# Altium integrated library Diffuser.IntLib: 173 symbols (continued)
## Linear Regulators - TPS7A0533PDBVT (continued)
IC REG LINEAR 3.3V 200MA SOT23-5; Manufacturer: Texas Instruments; PartNumber: TPS7A0508PDBVR; RefDes: RefDes; Type: DEV; Value: Value; Copyright: Copyright (C) 2021 Accelerated Designs. All rights reserved; Cost: 1.26; Website: https://www.digikey.co.nz/product-detail/en/texas-instruments/TPS7A0533PDBVT/296-50256-6-ND/9597159
footprint SOT-23-5
pins: 1 IN (power), 2 GND (power), 3 EN (in), 4 NC (power), 5 OUT (power)

## MAX14515AEWA+T
designator U?
Liquid Lens Driver for Small Camera Modules; Mfr_Name: Analog Devices Inc; Copyright: Copyright (C) 2023 Ultra Librarian. All rights reserved.; Manufacturer_Part_Number: MAX14515AEWA+T; Digi-Key_Part_Number_1: 175-MAX14515AEWA+TTR-ND; Digi-Key_Part_Number_2: 2156-MAX14515AEWA+T-ND; Digi-Key_Part_Number_3: MAX14515AEWA+T-ND; Digi-Key_Part_Number_4: MAX14515AEWA+TCT-ND; Digi-Key_Part_Number_5: MAX14515AEWA+TDKR-ND; Digi-Key_Part_Number_6: MAX14515AEWA+TTR-ND; RefDes: RefDes; Type: DEV
footprint 21-0210C_W81A2-1_MXM
pins: 1 SCL, 2 EN, 3 GND (power), 4 VA, 5 SDA, 6 VDD (power), 7 VREF (power), 8 VB

## MAX22246CAWA+
designator U?
CAN, RS232, RS422, RS485 Digital Isolator 5000Vrms 2 Channel 200Mbps 50kV/µs (Typ) CMTI 8-SOIC (0.295", 7.50mm Width); Mfr_Name: Analog Devices Inc; Copyright: Copyright (C) 2023 Ultra Librarian. All rights reserved.; Manufacturer_Part_Number: MAX22246CAWA+; Digi-Key_Part_Number_1: 175-MAX22246CAWA+-ND; RefDes: RefDes; Type: DEV
footprint 21-100415_MXM
pins: 1 VDDA (power), 2 OUT1 (out), 3 IN2 (in), 4 GNDA (power), 5 GNDB (power), 6 OUT2 (out), 7 IN1 (in), 8 VDDB (power)

## MBRM120LT3G
designator D?
Diode 20 V 1A Surface Mount Powermite; Mfr_Name: onsemi; Type: DEV; Copyright: Copyright (C) 2024 Ultra Librarian. All rights reserved.; Manufacturer_Part_Number: MBRM120LT3G; RefDes: RefDes
footprint DO-216AA (Footprint not found)
pins: 1 K, 2 A

## MCP4725A2T-ECH
designator U?, comment MCP4725A2T-E/CH
I2C DAC; Mfr_Name: Microchip; Copyright: Copyright (C) 2024 Ultra Librarian. All rights reserved.; Manufacturer_Part_Number: MCP4725A2T-E/CH; RefDes: RefDes; Type: DEV
footprint SOT-23-6_MC_MCH
pins: 1 VOUT, 2 VSS, 3 VDD, 4 SDA, 5 SCL, 6 A0

## MCP4822T-ESN
designator U?, comment MCP4822T-E/SN
12 Bit Digital to Analog Converter 2 8-SOIC; Mfr_Name: Microchip; Copyright: Copyright (C) 2024 Ultra Librarian. All rights reserved.; Manufacturer_Part_Number: MCP4822T-E/SN; RefDes: RefDes; Type: DEV
footprint MSOP8_MC_MCH-M (Footprint not found)
pins: 1 VDD, 2 nCS, 3 SCK, 4 SDI, 5 nLDAC, 6 VOUTB, 7 GND, 8 VOUTA

## MCP4921
designator U?, comment MCP4921-E/SN-ND
12 Bit Digital to Analog Converter 1 8-SOIC; Mfr_Name: Microchip; Manufacturer_Part_Number: MCP4822T-E/SN; Copyright: Copyright (C) 2024 Ultra Librarian. All rights reserved.; RefDes: RefDes; Type: DEV
footprint 8-SOIC - DAC
pins: 1 VDD, 2 nCS, 3 SCK, 4 SDI, 5 nLDAC, 6 VREFA, 7 GND, 8 VOUTA

## MCP7940M-ISN
designator U?, comment MCP7940M-I/SN
Real Time Clock (RTC) IC Clock/Calendar 64B I2C, 2-Wire Serial 8-SOIC (0.154", 3.90mm Width); Mfr_Name: Microchip; Copyright: Copyright (C) 2024 Ultra Librarian. All rights reserved.; Manufacturer_Part_Number: MCP7940M-I/SN; RefDes: RefDes; Type: DEV
footprint SOIC8-N_MC_MCH (Footprint not found)
pins: 1 X1 (in), 2 X2 (out), 4 GND (power), 5 SDA (io), 6 SCL (in), 7 MFP (out), 8 VCC (power)

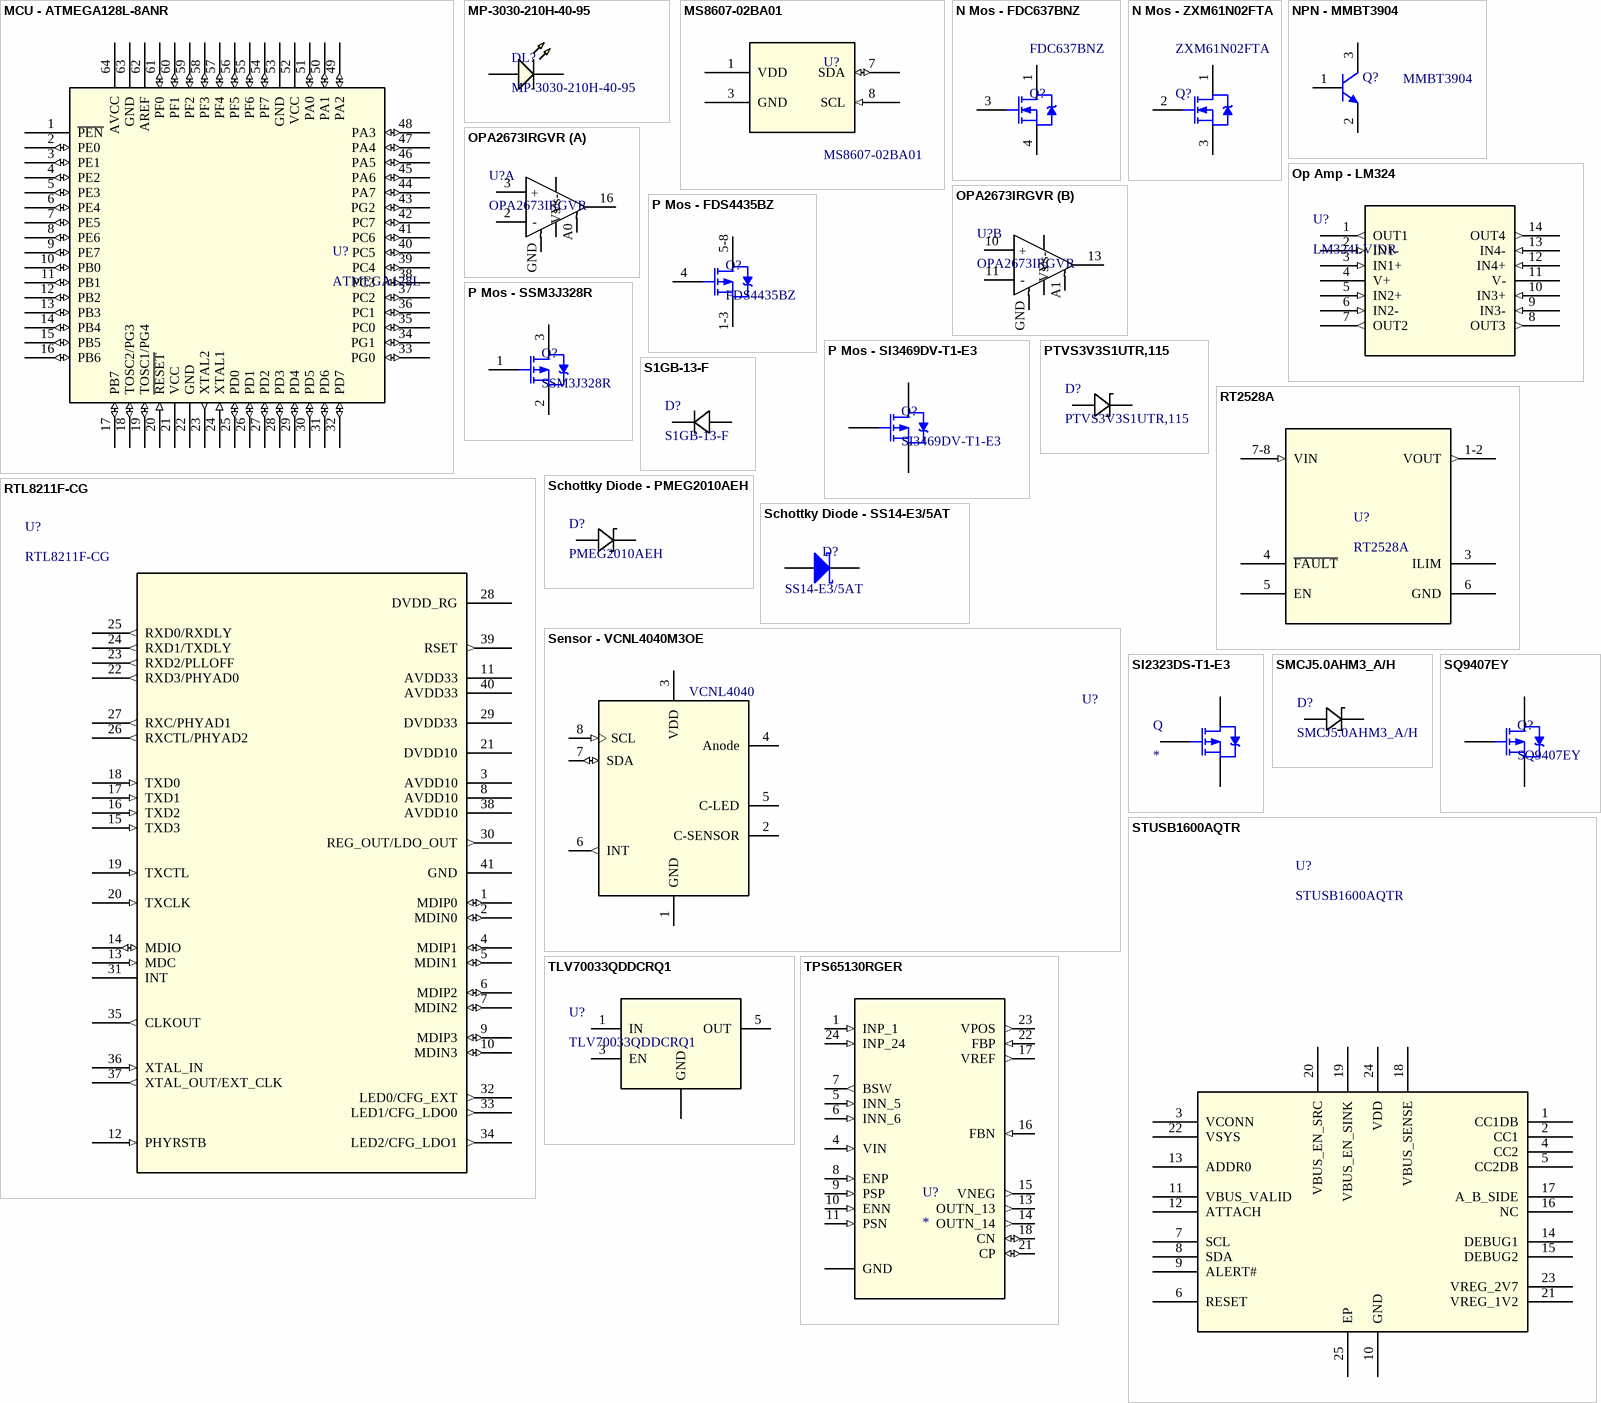
[diagram p4: symbols MCU - ATMEGA128L-8ANR to TPS65130RGER]

## MCU - ATMEGA128L-8ANR
designator U?, comment ATMEGA128L
IC MCU 8BIT 128KB FLASH 64TQFP; Cost: 9.46000; Website: https://www.digikey.co.nz/product-detail/en/microchip-technology/ATMEGA128L-8ANR/1611-ATMEGA128L-8ANRCT-ND/6831916
footprint 64-TQFP
pins: 1 ~{PEN}, 2 PE0 (io), 3 PE1 (io), 4 PE2 (io), 5 PE3 (io), 6 PE4 (io), 7 PE5 (io), 8 PE6 (io), 9 PE7 (io), 10 PB0 (io), 11 PB1 (io), 12 PB2 (io), 13 PB3 (io), 14 PB4 (io), 15 PB5 (io), 16 PB6 (io), 17 PB7 (io), 18 TOSC2/PG3 (io), 19 TOSC1/PG4 (io), 20 ~{RESET} (in), 21 VCC (power), 22 GND (power), 23 XTAL2 (out), 24 XTAL1 (in), 25 PD0 (io), 26 PD1 (io), 27 PD2 (io), 28 PD3 (io), 29 PD4 (io), 30 PD5 (io), 31 PD6 (io), 32 PD7 (io), 33 PG0 (io), 34 PG1 (io), 35 PC0 (io), 36 PC1 (io), 37 PC2 (io), 38 PC3 (io), 39 PC4 (io), 40 PC5 (io), 41 PC6 (io), 42 PC7 (io), 43 PG2 (io), 44 PA7 (io), 45 PA6 (io), 46 PA5 (io), 47 PA4 (io), 48 PA3 (io), 49 PA2 (io), 50 PA1 (io), 51 PA0 (io), 52 VCC (power), 53 GND (power), 54 PF7 (io), 55 PF6 (io), 56 PF5 (io), 57 PF4 (io), 58 PF3 (io), 59 PF2 (io), 60 PF1 (io), 61 PF0 (io), 62 AREF, 63 GND (power), 64 AVCC (power)

## MP-3030-210H-40-95
designator DL?
LED Lighting MP-3030-210H White, Neutral 4000K 6V 150mA 110° 1212 (3030 Metric); Dot: Cathode
footprint LED_MP-3030-21C2-40-90
pins: A, C 1

## MS8607-02BA01
designator U?
PHT Combination Sensor QFN package 5 x 3 x 1 mm3; Manufacturer_Name: TE Connectivity; Geometry.Height: 1mm; Manufacturer_Part_Number: MS8607-02BA01; Mouser Part Number: N/A; Mouser Price/Stock: https://www.mouser.co.uk/ProductDetail/TE-Connectivity/MS8607-02BA01?qs=DRkmTr78QARZ5izyG9yiPQ%3D%3D; Arrow Part Number: *; Arrow Price/Stock: *; Mouser Testing Part Number: *; Mouser Testing Price/Stock: *; Datasheet Link: https://www.datasheet5.com/part/MS8607-02BA01/TE%20Connectivity%20Ltd
footprint MS860702BA01
pins: 1 VDD, 3 GND, 7 SDA (io), 8 SCL (in)

## N Mos - FDC637BNZ
designator Q?, comment FDC637BNZ
MOSFET N-CH 20V 6.2A TSOT-23-6; Cost: 0.76; Website: https://www.digikey.co.nz/product-detail/en/on-semiconductor/FDC637BNZ/FDC637BNZCT-ND/1768373; Manufacturer Part Number: FDC637BNZ
footprint 6TSOP
pins: 1 3 "Drain", 3 1 "Gate", 4 "Source"

## N Mos - ZXM61N02FTA
designator Q?, comment ZXM61N02FTA
MOSFET N-CH 20V 1.7A SOT23-3; Manufacturer: Diodes Inc; FET Type: MOSFET N-Channel, Metal Oxide; Gate Charge (Qg) @ Vgs: 3.4nC @ 4.5V; Input Capacitance (Ciss) @ Vds: 160pF @ 15V; Power - Max: 625mW; Rds On (Max) @ Id, Vgs: 180 mOhm @ 930mA, 4.5V; Vgs(th) (Max) @ Id: 700mV @ 250µA; Supplier 1: Farnell; Supplier 2: Digi-Key; Current - Continuous Drain (Id) @ 25° C: 1.7A; Drain to Source Voltage (Vdss): 20V; Package / Case: TO-236-3, SC-59, SOT-23-3; Pricing: 1=0.79, 10=0.658, 25=0.5772, 100=0.4939, 250=0.42836, 500=0.36284, 1000=0.27972 (NZD); Supplier Part Number 1: 9525270; Supplier Part Number 2: ZXM61N02FCT-ND; Storage Location: PCB Assembly WS; Supplier: ECE Dept; Cost: 0.8; Website: https://www.digikey.co.nz/product-detail/en/diodes-incorporated/ZXM61N02FTA/ZXM61N02FCT-ND/272443; Manufacturer Part Number: ZXM61N02FTA
footprint SOT-23F
pins: 1 3 "Drain", 2 1 "Gate", 3 4 "Source"

## NPN - MMBT3904
designator Q?, comment MMBT3904
TRANS NPN 40V 200MA TO236AB; Manufacturer: NXP; Cost: 0.17; Website: https://www.digikey.co.nz/product-detail/en/nexperia-usa-inc/MMBT3904-215/1727-4044-1-ND/1944320; Value: MMBT3904
footprint SOT23_NXP-M
pins: 1, 2, 3

## Op Amp - LM324
designator U?, comment LM324LVIDR
IC OPAMP GP 4 CIRCUIT 14SOIC; Cost: 0.79; Website: https://www.digikey.co.nz/product-detail/en/texas-instruments/LM324LVIDR/296-51262-1-ND/9745626
footprint 14-SOIC
pins: 1 OUT1 (out), 2 IN1- (in), 3 IN1+ (in), 4 V+ (power), 5 IN2+ (in), 6 IN2- (in), 7 OUT2 (out), 8 OUT3 (out), 9 IN3- (in), 10 IN3+ (in), 11 V- (power), 12 IN4+ (in), 13 IN4- (in), 14 OUT4 (out)

## OPA2673IRGVR
designator U?
Current Feedback Amplifier 2 Circuit 16-VQFN (4x4); Mfr_Name: Texas Instruments; Copyright: Copyright (C) 2024 Ultra Librarian. All rights reserved.; Manufacturer_Part_Number: OPA2673IRGVR; RefDes: RefDes; Type: DEV
footprint RGV16_2P16X2P16
part A pins: 2 IN- (hiz), 3 IN+ (hiz), 7 Vs- (power), 14 Vs+ (power), 16 OUTA, A0, GND (power)
part B pins: 7 Vs- (power), 10 IN+ (hiz), 11 IN- (hiz), 13 OUTA, 14 Vs+ (power), A1, GND (power)
part A text: +; -
part B text: +; -

## P Mos - FDS4435BZ
designator Q?, comment FDS4435BZ
MOSFET P-CH 30V 8.8A 8SOIC; MF: ON Semiconductor / Fairchild; DigiKey-Purchase-URL: https://snapeda.com/shop?store=DigiKey&id=4825985; Package: None; SnapEDA_Link: https://www.snapeda.com/parts/FDS4435BZ/Fairchild%20Semiconductor/view-part/4825985/?ref=snap; Value: *; Mouser-Purchase-URL: https://snapeda.com/shop?store=Mouser&id=4825985; MP: FDS4435BZ; Arrow_Electronics-Purchase-URL: https://snapeda.com/shop?store=Arrow+Electronics&id=4825985; Availability: Unavailable; Price: None; Cost: 1.04; Website: https://www.digikey.co.nz/product-detail/en/on-semiconductor/FDS4435BZ/FDS4435BZCT-ND/1305829
footprint SO08-E3
pins: 1-3 2 "Source", 4 1 "Gate", 5-8 3 "Drain"

## P Mos - SI3469DV-T1-E3
designator Q?, comment SI3469DV-T1-E3
MOSFET P-CH 20V 5A 6TSOP; Built_By: EMA_Anthony; Vendor: Vishay; SourceLibrary: Vishay_2019-11-13; Type: DEV; Copyright: Copyright (C) 2018 Accelerated Designs. All rights reserved; Datasheet: VY1332M51Y5UC63V0; Manufacturer_Part_Number: SI3469DV-T1-E3; RefDes: RefDes; Cost: 1.1; Website: https://www.digikey.co.nz/product-detail/en/vishay-siliconix/SI3469DV-T1-E3/SI3469DV-T1-E3CT-ND/1656880
footprint 6TSOP
pins: 1 3 "Drain", 3 1 "Gate", 4 2 "Source"

## P Mos - SSM3J328R
designator Q?, comment SSM3J328R
MOSFET P-CH 20V 6A SOT23F; Cost: 0.68; Website: https://www.digikey.co.nz/product-detail/en/toshiba-semiconductor-and-storage/SSM3J328R-LF/SSM3J328RLFCT-ND/2753207
footprint SOT-23F
pins: 1 "Gate", 2 "Source", 3 "Drain"

## PTVS3V3S1UTR,115
designator D?
8V Clamp 43.8A Ipp Tvs Diode Surface Mount SOD-123W; Mfr_Name: Nexperia; Type: DEV; Copyright: Copyright (C) 2023 Ultra Librarian. All rights reserved.; Manufacturer_Part_Number: PTVS3V3S1UTR,115; Digi-Key_Part_Number_1: 1727-1416-2-ND; Digi-Key_Part_Number_2: 1727-1416-1-ND; Digi-Key_Part_Number_3: 1727-1416-6-ND; RefDes: RefDes
footprint CR_PTVS3V_NEX-M
pins: 1, 2

## RT2528A
designator U?
Power Switch/Driver 1:1 P-Channel 2.5A 8-SOP-EP
footprint SOP-8 - RT2528A
pins: 1-2 VOUT (out), 3 ILIM, 4 ~{FAULT}, 5 EN, 6 GND (power), 7-8 VIN (in)

## RTL8211F-CG
designator U?
INTEGRATED 10/100/1000M ETHERNET / PRECISION TRANSCEIVER; Mfr_Name: Realtek; Copyright: Copyright (C) 2023 Ultra Librarian. All rights reserved.; Manufacturer_Part_Number: RTL8211F-CG; RefDes: RefDes; Type: DEV
footprint RTL8211F-CG_RTK-M
pins: 1 MDIP0 (io), 2 MDIN0 (io), 3 AVDD10 (power), 4 MDIP1 (io), 5 MDIN1 (io), 6 MDIP2 (io), 7 MDIN2 (io), 8 AVDD10 (power), 9 MDIP3 (io), 10 MDIN3 (io), 11 AVDD33 (power), 12 PHYRSTB (in), 13 MDC (in), 14 MDIO (io), 15 TXD3 (in), 16 TXD2 (in), 17 TXD1 (in), 18 TXD0 (in), 19 TXCTL (in), 20 TXCLK (in), 21 DVDD10 (power), 22 RXD3/PHYAD0 (out), 23 RXD2/PLLOFF (out), 24 RXD1/TXDLY (out), 25 RXD0/RXDLY (out), 26 RXCTL/PHYAD2 (out), 27 RXC/PHYAD1 (out), 28 DVDD_RG (power), 29 DVDD33 (power), 30 REG_OUT/LDO_OUT (out), 31 INT, 32 LED0/CFG_EXT (out), 33 LED1/CFG_LDO0 (out), 34 LED2/CFG_LDO1 (out), 35 CLKOUT (out), 36 XTAL_IN (in), 37 XTAL_OUT/EXT_CLK (out), 38 AVDD10 (power), 39 RSET (out), 40 AVDD33 (power), 41 GND

## S1GB-13-F
designator D?
Diode 400 V 1A Surface Mount SMB
footprint DO-214AA, SMB (Footprint not found)
pins: 1, 2

## Schottky Diode - PMEG2010AEH
designator D?, comment PMEG2010AEH
DIODE SCHOTTKY 20V 1A SOD123F; Website: https://www.digikey.co.nz/product-detail/en/nexperia-usa-inc/PMEG2010AEH-115/1727-3856-1-ND/1589927; Cost: 0.65
footprint SOD-123F
pins: 1, 2

## Schottky Diode - SS14-E3/5AT
designator D?, comment SS14-E3/5AT
DIODE, SCHOTTKY, 1A, 40V, DO-214AC; Manufacturer: VISHAY GENERAL SEMICONDUCTOR; Diode Case Style: DO-214; Forward Current If(AV): 1; Diode Type: Schottky; Package / Case: SMA; Supplier 1: Digi-Key; Supplier Part Number 1: SS14-E3/5ATGICT-ND; Supplier 2: Farnell; Supplier Part Number 2: 9551280; Supplier 3: Mouser; Supplier Part Number 3: 625-SS14-E3/11T; Storage Location: PCB Assembly WS; Supplier: ECE Dept; Website: https://www.digikey.co.nz/product-detail/en/vishay-general-semiconductor-diodes-division/SS14-E3-5AT/SS14-E3-5ATGICT-ND/2880305; Cost: 0.71; Manufacturer Part Number: SS14-E3/5AT
footprint DO-214AC (Footprint not found)
pins: 1 K, 2 A

## Sensor - VCNL4040M3OE
designator U?, comment VCNL4040
Optical Sensor Ambient 550nm I2C 8-SMD Module; MF: Vishay; MP: VCNL4040M3OE; Package: SMD-8 Vishay; SnapEDA_Link: https://www.snapeda.com/parts/VCNL4040M3OE/Vishay%20Semiconductor%20Opto%20Division/view-part/434280/?ref=snap; Availability: Unavailable; Cost: 4.18; Website: https://www.digikey.co.nz/product-detail/en/vishay-semiconductor-opto-division/VCNL4040M3OE/VCNL4040M3OECT-ND/5171285; Value: VCNL4040
footprint VCNL4040 (Optical Sensor Ambient 550nm I2C 8-SMD Module)
pins: 1 GND (power), 2 C-SENSOR, 3 VDD (power), 4 Anode (power), 5 C-LED, 6 INT (out), 7 SDA (io), 8 SCL (in)

## SI2323DS-T1-E3
designator Q
P-Channel 20V 3.7A _Ta_ 750mW _Ta_ Surface Mount SOT-23-3 _TO-236_; MF: Vishay Siliconix; MP: SI2323DS-T1-E3; Value: *; Availability: Unavailable; Package: SOT-23-3 Vishay; Price: None; SnapEDA_Link: https://www.snapeda.com/parts/SI2323DS-T1-E3/Vishay%20Siliconix/view-part/1098076/?ref=snap
footprint SOT23
pins: 1 G "Gate", 2 S "Source", 3 D "Drain"

## SMCJ5.0AHM3_A/H
designator D?
9.2V Clamp 163A Ipp Tvs Diode Surface Mount DO-214AB (SMC)
footprint DO-214AB_SMC
pins: 1, 2

## SQ9407EY
designator Q?
P-Channel 60 V 4.6A (Tc) 3.75W (Tc) Surface Mount 8-SOIC
footprint SO08-E3
pins: 1-3 2 "Source", 4 1 "Gate", 5-8 3 "Drain"

## STUSB1600AQTR
designator U?
ST MPU Programmer; Mfr_Name: STMicroelectronics; Copyright: Copyright (C) 2023 Ultra Librarian. All rights reserved.; Manufacturer_Part_Number: STUSB1600AQTR; Digi-Key_Part_Number_1: 497-17647-2-ND; Digi-Key_Part_Number_2: 497-17647-1-ND; Digi-Key_Part_Number_3: 497-17647-6-ND; RefDes: RefDes; Type: DEV
footprint QFN_00AQTR_STM-M
pins: 1 CC1DB, 2 CC1, 3 VCONN, 4 CC2, 5 CC2DB, 6 RESET, 7 SCL, 8 SDA, 9 ALERT#, 10 GND, 11 VBUS_VALID, 12 ATTACH, 13 ADDR0, 14 DEBUG1, 15 DEBUG2, 16 NC, 17 A_B_SIDE, 18 VBUS_SENSE, 19 VBUS_EN_SINK, 20 VBUS_EN_SRC, 21 VREG_1V2, 22 VSYS, 23 VREG_2V7, 24 VDD (power), 25 EP

## TLV70033QDDCRQ1
designator U?
Linear Voltage Regulator IC Positive Fixed 1 Output 200mA SOT-23-THIN; Mfr_Name: Texas Instruments; Copyright: Copyright (C) 2023 Ultra Librarian. All rights reserved.; Manufacturer_Part_Number: TLV70033QDDCRQ1; Digi-Key_Part_Number_1: 296-27780-1-ND; Digi-Key_Part_Number_2: 296-27780-2-ND; Digi-Key_Part_Number_3: 296-27780-6-ND; RefDes: RefDes; Type: DEV
footprint DDC5_TEX-M
pins: 1 IN (power), 3 EN, 5 OUT (power), GND

## TPS65130RGER
designator U?
Boost, Buck-Boost Switching Regulator IC Positive and Negative (Dual Rail) Adjustable 3.2V, -2V 2 Output 700mA (Switch) 24-VFQFN Exposed Pad; MP: TPS65130RGER; Price: None; Package: None; Availability: Unavailable; Value: *
footprint QFN50P400X400X100-25N
pins: 1 INP_1 (in), 4 VIN (in), 5 INN_5 (in), 6 INN_6 (in), 7 BSW (out), 8 ENP (in), 9 PSP (in), 10 ENN (in), 11 PSN (in), 13 OUTN_13 (out), 14 OUTN_14 (out), 15 VNEG (out), 16 FBN (in), 17 VREF (out), 18 CN (io), 21 CP (io), 22 FBP (in), 23 VPOS (out), 24 INP_24 (in), 25 GND

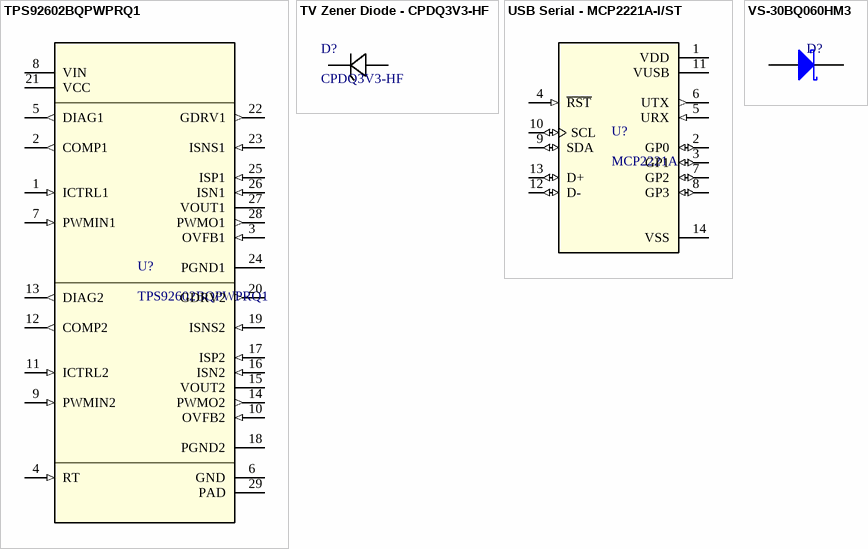
[diagram p5: symbols TPS92602BQPWPRQ1 to VS-30BQ060HM3]

## TPS92602BQPWPRQ1
designator U?
LED Driver IC 2 Output DC DC Controller Flyback, SEPIC, Step-Up (Boost) Analog, PWM Dimming 1.5A 28-HTSSOP; Mfr_Name: Texas Instruments; Type: DEV; RefDes: RefDes; Copyright: Copyright (C) 2022 Ultra Librarian. All rights reserved.; Manufacturer_Part_Number: TPS92602BQPWPRQ1
footprint PWP0028C_M
pins: 1 ICTRL1 (in), 2 COMP1 (out), 3 OVFB1 (in), 4 RT (in), 5 DIAG1 (out), 6 GND (power), 7 PWMIN1 (in), 8 VIN (power), 9 PWMIN2 (in), 10 OVFB2 (in), 11 ICTRL2 (in), 12 COMP2 (out), 13 DIAG2 (out), 14 PWMO2 (out), 15 VOUT2 (power), 16 ISN2 (in), 17 ISP2 (in), 18 PGND2 (power), 19 ISNS2 (in), 20 GDRV2 (out), 21 VCC (power), 22 GDRV1 (out), 23 ISNS1 (in), 24 PGND1 (power), 25 ISP1 (in), 26 ISN1 (in), 27 VOUT1 (power), 28 PWMO1 (out), 29 PAD (power)

## TV Zener Diode - CPDQ3V3-HF
designator D?, comment CPDQ3V3-HF
TVS DIODE 3.3VWM 14.1VC 0402; Vendor: Comchip; Built_By: EMA_UL_Team; SourceLibrary: ComchipTechnology_2015-04-20; Type: DEV; Manufacturer_Part_Number: CPDQ3V3-HF; Copyright: Copyright (C) 2021 Accelerated Designs. All rights reserved; RefDes: RefDes; Website: https://www.digikey.co.nz/product-detail/en/comchip-technology/CPDQ3V3-HF/641-1476-1-ND/3726320; Cost: 0.46
footprint SOD-923F (Footprint not found)
pins: 1, 2

## USB Serial - MCP2221A-I/ST
designator U?, comment MCP2221A
USB Bridge, USB to I2C/UART USB 2.0 I2C, UART Interface 14-SOIC; Cost: 3.64; Website: https://www.digikey.co.nz/product-detail/en/microchip-technology/MCP2221A-I-SL/MCP2221A-I-SL-ND/6009297; Backup - QFN: https://www.digikey.co.nz/product-detail/en/microchip-technology/MCP2221A-I-ML/MCP2221A-I-ML-ND/6009295
footprint 14-SOIC
pins: 1 VDD (power), 2 GP0 (io), 3 GP1 (io), 4 ~{RST} (in), 5 URX (in), 6 UTX (out), 7 GP2 (io), 8 GP3 (io), 9 SDA (io), 10 SCL (io), 11 VUSB (power), 12 D- (io), 13 D+ (io), 14 VSS (power)

## VS-30BQ060HM3
designator D?  (value not drawn)
DIODE SCHOTTKY 60V 3A DO214AB; Diode Case Style: DO-214; Forward Current If(AV): 3; Diode Type: Schottky
footprint CR_0-M3/9AT_VIS
pins: 1 K, 2 A


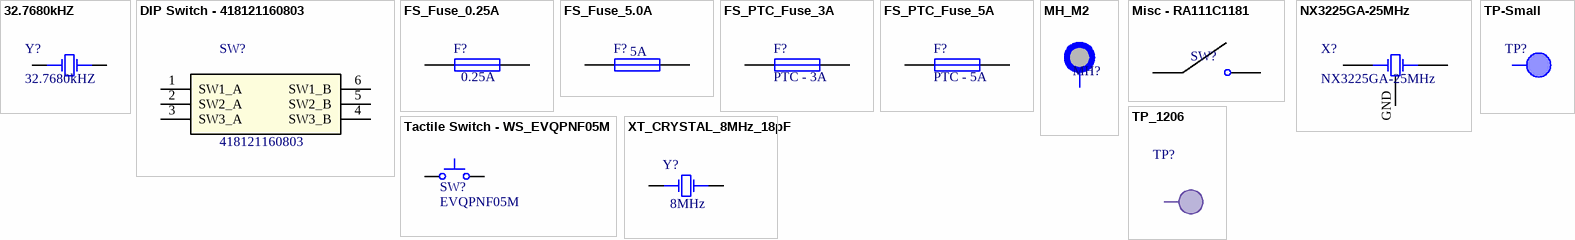
[diagram p6: symbols 32.7680kHZ to XT_CRYSTAL_8MHz_18pF]

## 32.7680kHZ
designator Y?
32.768 kHz ±20ppm Crystal 9pF 60 kOhms Cylindrical Can, Radial; MP: MS1V-T1K-32.768KHZ-9PF-20PPM-TA-QC-AU; MF: Micro Crystal AG; SnapEDA_Link: https://www.snapeda.com/parts/MS1V-T1K-32.768KHZ-9PF-20PPM-TA-QC-AU/Micro+Crystal/view-part/?ref=snap; Value: *; Check_prices: https://www.snapeda.com/parts/MS1V-T1K-32.768KHZ-9PF-20PPM-TA-QC-AU/Micro+Crystal/view-part/?ref=eda; Purchase-URL: https://pricing.snapeda.com/search/part/MS1V-T1K-32.768KHZ-9PF-20PPM-TA-QC-AU/?ref=eda; Package: SMD-3 Micro Crystal
footprint XTAL_MS1V-T1K-32.768KHZ-9PF-20PPM-TA-QC-AU (Footprint not found)
pins: 1, 2

## DIP Switch - 418121160803
designator SW?, comment 418121160803
3 Way Surface Mount DIP Switch 3P, Flat Actuator; Manufacturer_Name: Wurth Elektronik; Geometry.Height: 3mm; Manufacturer_Part_Number: 418121160803; Mouser Part Number: 710-418121160803; Mouser Price/Stock: https://www.mouser.co.uk/ProductDetail/Wurth-Elektronik/418121160803/?qs=wr8lucFkNMXIInquC4UPzg%3D%3D; Arrow Part Number: *; Arrow Price/Stock: *; Mouser Testing Part Number: *; Mouser Testing Price/Stock: *; Datasheet Link: https://katalog.we-online.com/em/datasheet/4181211608xx.pdf
footprint SOP254P980X300-6N
pins: 1 SW1_A, 2 SW2_A, 3 SW3_A, 4 SW3_B, 5 SW2_B, 6 SW1_B

## FS_Fuse_0.25A
designator F?, comment 0.25A
Fuse 0.25A Very Fast Acting 1206 SMD; Manufacturer: MULTICOMP; Manufacturer PN: MC12CF.250; Breaking Capacity: 50A @ 32V AC / 63; Device Marking: D; Fuse Case Style: 1206; Fuse Current: 250; Supplier: ECE Dept; Storage Location: PCB Assembly WS; Blow Characteristic: Very Fast Acting; Fuse Type Blowing Characteristic: Very Fast Acting; Supplier 1: Farnell; Supplier Part Number 1: 1841020; Manufacturer Part Number: MC12CF.250; Website: https://www.digikey.co.nz/product-detail/en/bel-fuse-inc/C1F-250/507-1874-1-ND/4968161; Cost: 0.38; Value: 0.25A
footprint C1F 5 (FUSE 5.0A 125VAC FAST 1206)
pins: 1, 2

## FS_Fuse_5.0A
designator F?, comment 5A
Fuse 5.0A Fast Acting 1206 SMD; Manufacturer Part Number: C1F5; Manufacturer: Bel TRP; Voltage Rating (AC): 125V; Voltage Rating (DC): 63V; DC Cold Resistance: 19mR; Fuse Type: Board Mount (Cartridge Style Excluded); Approvals: CE,cURus; Mount: Surface Mount; Case/Package: 1206; Number of Pins: 2; Case Code (Metric): 3216; Case Code (Imperial): 1206; Contact Plating: Nickel,Tin; Min Operating Temperature: -55°C; Max Operating Temperature: 125°C; Packaging: Tape and Reel; Voltage Rating: 125V; Length: 0.126inch; Width: 0.062inch; Supplier 1: Digi-Key; Stock 1: 725; Pricing 1: 1=0.32, 5=0.312, 10=0.298, 50=0.2662, 100=0.2479, 250=0.22032, 500=0.1836, 1000=0.17442 (USD); ComponentLink1URL: http://www.farnell.com/datasheets/2571625.pdf; ComponentLink1Description: http://www.farnell.com/datasheets/2571625.pdf; ComponentLink2URL: http://belfuse.com/pdfs/C1F.pdf; ComponentLink2Description: http://belfuse.com/pdfs/C1F.pdf; ComponentLink3URL: http://www.mouser.com/ds/2/643/C1F-594910.pdf; ComponentLink3Description: http://www.mouser.com/ds/2/643/C1F-594910.pdf; ComponentLink4URL: https://belfuse.com/resources/StewartConnector/C1F.pdf; ComponentLink4Description: https://belfuse.com/resources/StewartConnector/C1F.pdf; Current Rating: 5A; Supplier Part Number 1: 507-1886-1-ND; Supplier 2: Element14; Supplier Part Number 2: 2848595; Website: https://www.digikey.co.nz/product-detail/en/C1F%25205/507-1886-1-ND/4968166?utm_campaign=buynow&utm_medium=aggregator&curr=nzd&utm_source=octopart; Cost: 0.38; Series: C1F; Value: 5A
footprint C1F 5 (FUSE 5.0A 125VAC FAST 1206)
pins: 1, 2

## FS_PTC_Fuse_3A
designator F?, comment PTC - 3A
PTC RESET FUSE 3.0A 24V 1812; Website: https://www.digikey.co.nz/product-detail/en/littelfuse-inc/1812L300-24SLER/18-1812L300-24SLERCT-ND/12807142; Cost: 3.44; Value: PTC - 3A
footprint PTC_Fuse_1812 (1812 - 4.60mm x 3.24mm)
pins: 1, 2

## FS_PTC_Fuse_5A
designator F?, comment PTC - 5A
PTC RESET FUSE 16V 2.5A 2920; Website: https://www.digikey.co.nz/product-detail/en/bel-fuse-inc/0ZCF0250FF2C/507-1750-1-ND/4156185; Cost: 0.37; Value: PTC - 5A
footprint PTC_Fuse_2920 (F_2920 - 7.36mm x 5.12mm)
pins: 1, 2

## MH_M2
designator MH?
Mounting Holes
footprint MH_M2
pins: 1

## Misc - RA111C1181
designator SW?
POWER ROCKER SWITCH WITH PVC CAP; Cost: 1.12; Website: https://www.digikey.co.nz/product-detail/en/e-switch/RA111C1181/EG5676-ND/8540800
footprint Rocker Switch SPST (Rocker Switch SPST 16A (AC) 125V Panel Mount, Snap-In)
pins: 1, 2

## NX3225GA-25MHz
designator X?
25 MHz ±20ppm Crystal 8pF 50 Ohms 4-SMD, No Lead; Mfr_Name: NDK; Manufacturer_Part_Number: NX3225GA-25.000M-STD-CRG-2; Copyright: Copyright (C) 2023 Ultra Librarian. All rights reserved.; Digi-Key_Part_Number_1: 644-1259-2-ND; Digi-Key_Part_Number_2: 644-1259-1-ND; Digi-Key_Part_Number_3: 644-1259-6-ND; RefDes: RefDes; Type: DEV
footprint NX3225GA-25MHz
pins: 1, 3, GND

## Tactile Switch - WS_EVQPNF05M
designator SW?, comment EVQPNF05M
Panasonic 6 x 3.5mm SMD Light Touch Switch Type SMD; PackageDescription: 6.0 x 3.5 mm; Supplier 1: Farnell; Supplier Part Number 1: 2079481; Manufacturer: Panasonic; Manufacturer PN: EVQPNF05M; Supplier 2: Digi-Key; Supplier Part Number 2: P13598SCT-ND; Storage Location: PCB Assembly WS; Supplier: ECE Dept; Cost: 0.87; Website: https://www.digikey.co.nz/product-detail/en/panasonic-electronic-components/EVQ-PNF05M/P13598SCT-ND/1245519
footprint Tactile Switche - EVQPNF05M (Panansonic light touch SMD push button switch)
pins: 1, 2

## TP-Small
designator TP?
Use for basic signals
footprint TP-Small
pins: 1

## TP_1206
designator TP?  (no BOM)
TP, 325mm x 1.65mm); Manufacturer: Harwin Inc; Manufacturer Part Number: S1751-46R; Use: (SPI, I2C, PWM); Manufacturer PN: *; Storage Location: ProtoPlace; Mounting Type: Surface Mount; Type: PC Test Point; Supplier 1: Digi-Key; Supplier Part Number 1: 952-1478-2-ND; Supplier 2: Farnell; Supplier Part Number 2: 1826282; Supplier: ECE Dept; Value: TP; Website: https://www.digikey.co.nz/product-detail/en/harwin-inc/S1751-46R/952-1478-1-ND/2264564; Cost: 0.44
footprint TP_1206 (Test Point Pad)
pins: 1

## XT_CRYSTAL_8MHz_18pF
designator Y?, comment 8MHz
CRYSTAL 8MHZ 18PF 6X3.5mm SMD; Cost: 0.95; Website: https://www.digikey.co.nz/product-detail/en/raltron-electronics/H10S-8-000-18-1020-EXT-TR/2151-H10S-8-000-18-1020-EXT-TRCT-ND/10272245; Value: 8MHz
footprint 6.0X3.5-4 (4 SMD 6.0X3.5 mm No Lead Crystal)
pins: 1 OSC1, 3 OSC2


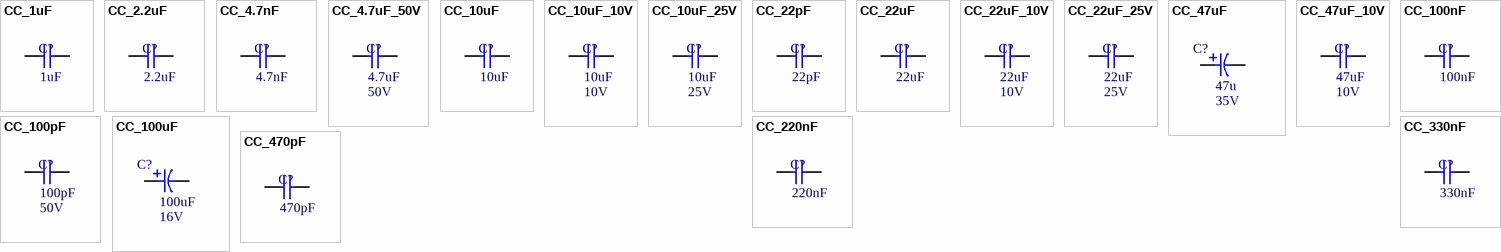
[diagram p7: symbols CC_1uF to CC_470pF]

## CC_1uF
designator C?, comment 1uF
CAP CER 1uF 16V X7R 0603; PackageReference: 0603; Website: https://www.digikey.co.nz/product-detail/en/samsung-electro-mechanics/CL10B105KO8NFNC/1276-1943-1-ND/3890029; Cost: 0.16; Value: 1uF
footprint C_0603 (Chip Capacitor, Body 1.6x0.8mm, IPC Low Density)
pins: 1, 2

## CC_2.2uF
designator C?, comment 2.2uF
CAP CER 2.2uF 10V X5R 0603; PackageReference: 0603; Website: https://www.digikey.co.nz/product-detail/en/samsung-electro-mechanics/CL10A225KP8NNNC/1276-1085-1-ND/3889171; Cost: 0.16; Value: 2.2uF
footprint C_0603 (Chip Capacitor, Body 1.6x0.8mm, IPC Low Density)
pins: 1, 2

## CC_4.7nF
designator C?, comment 4.7nF
CAP CER 4.7nF 50V X7R 0603; PackageReference: 0603; Website: https://www.digikey.co.nz/product-detail/en/samsung-electro-mechanics/CL10B472KB8NFNC/1276-2064-1-ND/3890150; Cost: 0.16; Value: 4.7nF
footprint C_0603 (Chip Capacitor, Body 1.6x0.8mm, IPC Low Density)
pins: 1, 2

## CC_4.7uF_50V
designator C?, comment Voltage: 50V  (hidden comment: 4.7uF)
4.7 µF ±10% 50V Ceramic Capacitor X7R 0805 (2012 Metric); Component: CGA4J1X7R1H475K125AC; Value: 4.7uF
footprint C_0805 (Chip Capacitor, Body 2.0x1.25mm, IPC Low Density)
pins: 1, 2

## CC_10uF
designator C?, comment 10uF
CAP CER 10uF 10V X5R 0805; PackageReference: 0805; Website: https://www.digikey.co.nz/product-detail/en/samsung-electro-mechanics/CL21A106KPFNNNG/1276-6456-1-ND/5958084; Cost: 0.19; Value: 10uF
footprint C_0805 (Chip Capacitor, Body 2.0x1.25mm, IPC Low Density)
pins: 1, 2

## CC_10uF_10V
designator C?, comment Vltage: 10V  (hidden comment: 10uF)
10 µF ±10% 10V Ceramic Capacitor X7R 0805 (2012 Metric); Component: GCM21BR71A106KE22K; Value: 10uF
footprint C_0805 (Chip Capacitor, Body 2.0x1.25mm, IPC Low Density)
pins: 1, 2

## CC_10uF_25V
designator C?, comment Voltage: 25V  (hidden comment: 10uF)
10 µF ±10% 25V Ceramic Capacitor X7S 0805 (2012 Metric); Component: CGA4J1X7S1E106K125AC; Value: 10uF
footprint C_0805 (Chip Capacitor, Body 2.0x1.25mm, IPC Low Density)
pins: 1, 2

## CC_22pF
designator C?, comment 22pF
CAP CER 22pF 50V C0G/NP0 0603; PackageReference: 0603; Website: https://www.digikey.co.nz/product-detail/en/samsung-electro-mechanics/CL10C220FB8NNNC/1276-2223-1-ND/3890309; Cost: 0.3; Value: 22pF
footprint C_0603 (Chip Capacitor, Body 1.6x0.8mm, IPC Low Density)
pins: 1, 2

## CC_22uF
designator C?, comment 22uF
CAP CER 22UF 10V X5R 0805; PackageReference: 0805; Website: https://www.digikey.co.nz/product-detail/en/samsung-electro-mechanics/CL21A226KPCLRNC/1276-6786-1-ND/5961645; Cost: 0.61; Value: 22uF
footprint C_0805 (Chip Capacitor, Body 2.0x1.25mm, IPC Low Density)
pins: 1, 2

## CC_22uF_10V
designator C?, comment Voltage: 10V  (hidden comment: 22uF)
22 µF ±10% 10V Ceramic Capacitor X7R 1206 (3216 Metric); Component: LMJ316BB7226KLHT; Value: 22uF
footprint C_1206
pins: 1, 2

## CC_22uF_25V
designator C?, comment Voltage: 25V  (hidden comment: 22uF)
22 µF ±10% 25V Ceramic Capacitor X5R 1206 (3216 Metric); Component: GRT31CR61E226KE01L; Value: 22uF
footprint C_1206
pins: 1, 2

## CC_47uF
designator C?, comment Voltage: 35V  (hidden comment: 47u)
47 µF Molded Tantalum Capacitors 35 V 2917 (7343 Metric) 500mOhm; Mfr_Name: Kemet; Manufacturer_Part_Number: T498X476K035ATE500; Type: DEV; Copyright: Copyright (C) 2023 Ultra Librarian. All rights reserved.; Digi-Key_Part_Number_1: 399-11397-2-ND; Digi-Key_Part_Number_2: 399-11397-1-ND; Digi-Key_Part_Number_3: 399-11397-6-ND; RefDes: RefDes; Value: 47u
footprint C_2917
pins: 1, 2

## CC_47uF_10V
designator C?, comment Voltage: 10V  (hidden comment: 47uF)
22 µF ±10% 10V Ceramic Capacitor X7R 1206 (3216 Metric); Component: GRT31CR61A476KE13L; Value: 47uF
footprint C_1206
pins: 1, 2

## CC_100nF
designator C?, comment 100nF
CAP CER 0.1uF 50V X7R 0603; PackageReference: 0603; Website: https://www.digikey.co.nz/product-detail/en/samsung-electro-mechanics/CL10B104KB8NFNC/1276-1934-1-ND/3890020; Cost: 0.16; Value: 100nF
footprint C_0603 (Chip Capacitor, Body 1.6x0.8mm, IPC Low Density)
pins: 1, 2

## CC_100pF
designator C?, comment Voltage: 50V  (hidden comment: 100pF)
CAP CER 100pF 50V C0G/NP0 0603; PackageReference: 0603; Value: 100pF
footprint C_0603 (Chip Capacitor, Body 1.6x0.8mm, IPC Low Density)
pins: 1, 2

## CC_100uF
designator C?, comment Voltage: 16V  (hidden comment: 100uF)
100 µF Molded Tantalum Capacitors 16 V 2917 (7343 Metric) 75mOhm; Component: T498X107K016ATE075; Value: 100uF
footprint C_2917
pins: 1, 2

## CC_220nF
designator C?, comment 220nF
CAP CER 0.220uF 50V X7R 0603; PackageReference: 0603; Website: https://www.digikey.co.nz/product-detail/en/samsung-electro-mechanics/CL10B104KB8NFNC/1276-1934-1-ND/3890020; Cost: 0.16; Value: 220nF
footprint C_0603 (Chip Capacitor, Body 1.6x0.8mm, IPC Low Density)
pins: 1, 2

## CC_330nF
designator C?, comment 330nF
CAP CER 330nF 16V X7R 0603; PackageReference: 0603; Website: https://www.digikey.co.nz/product-detail/en/samsung-electro-mechanics/CL10B334KO8NFNC/1276-2047-1-ND/3890133; Cost: 0.16; Value: 330nF
footprint C_0603 (Chip Capacitor, Body 1.6x0.8mm, IPC Low Density)
pins: 1, 2

## CC_470pF
designator C?, comment 470pF
CAP CER 470pF 50V C0G/NP0 0603; PackageReference: 0603; Value: 470pF
footprint C_0603 (Chip Capacitor, Body 1.6x0.8mm, IPC Low Density)
pins: 1, 2


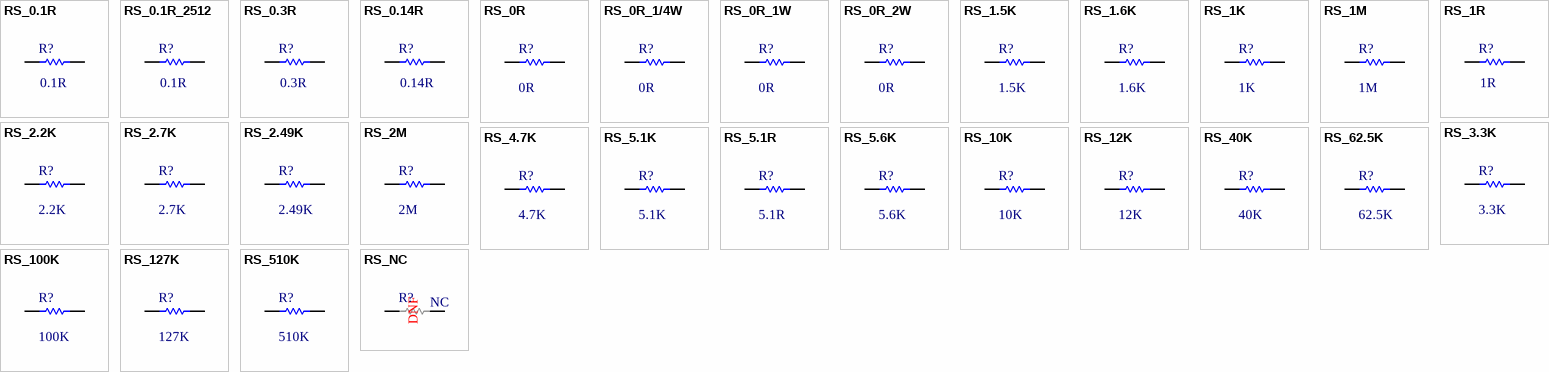
[diagram p8: symbols RS_0.1R to RS_NC]

## RS_0.1R
designator R?, comment 0.1R
RES 0.1R OHM 1% 1/3W 0805; Cost: 0.95; Website: https://www.digikey.co.nz/product-detail/en/koa-speer-electronics-inc/SR732ATTDR100F/2019-SR732ATTDR100FCT-ND/9847616; Supplier 1: Digi-Key; Supplier Part Number 1: 2019-SR732ATTDR100FCT-ND; Value: 0.1R
footprint R_0805 (2.0x1.25mm)
pins: 1, 2

## RS_0.1R_2512
designator R?, comment 0.1R
100 mOhms ±1% 2W Chip Resistor 2512 (6432 Metric) Automotive AEC-Q200, Current Sense Metal Element; Component: TLRH3AWTTER100F; Value: 0.1R
footprint R_2512
pins: 1, 2

## RS_0.3R
designator R?, comment 0.3R
RES 300m OHM 1% 1/3W 0805; Cost: 0.95; Website: https://www.digikey.co.nz/product-detail/en/koa-speer-electronics-inc/SR732ATTDR300F/2019-SR732ATTDR300FCT-ND/9847621; Value: 0.3R
footprint R_0805 (2.0x1.25mm)
pins: 1, 2

## RS_0.14R
designator R?, comment 0.14R
140 mOhms ±1% 0.5W, 1/2W Chip Resistor 1206 (3216 Metric) Automotive AEC-Q200, Current Sense, Moisture Resistant Metal Film; Component: MFLA1206R1400FS; Value: 0.14R
footprint R_1206 (Chip Inductor, Body 3.2x1.6mm, IPC Low Density)
pins: 1, 2

## RS_0R
designator R?, comment 0R
RES SMD 0 OHM JUMPER 1/10W 0603; Cost: 0.16; Website: https://www.digikey.co.nz/product-detail/en/yageo/RC0603FR-070RL/311-0-0HRCT-ND/4340584; Value: 0R
footprint R_0603 (1.6x0.8mm)
pins: 1, 2

## RS_0R_1/4W
designator R?, comment 0R
0 Ohms Jumper Chip Resistor 1206 (3216 Metric) Automotive AEC-Q200 Thick Film; Component: RMCF1206ZT0R00; Value: 0R
footprint R_1206 (Chip Inductor, Body 3.2x1.6mm, IPC Low Density)
pins: 1, 2

## RS_0R_1W
designator R?, comment 0R
0 Ohms Jumper Chip Resistor 2512 (6432 Metric) Automotive AEC-Q200 Metal Foil; Component: RMCF2512ZT0R00; Value: 0R
footprint R_2512
pins: 1, 2

## RS_0R_2W
designator R?, comment 0R
0 Ohms Jumper Chip Resistor 2512 (6432 Metric) Automotive AEC-Q200 Metal Foil; Component: HCJ2512ZT0R00; Value: 0R
footprint R_2512
pins: 1, 2

## RS_1.5K
designator R?, comment 1.5K
RES SMD 1.5K OHM 1% 1/10W 0603; Cost: 0.16; Value: 1.5K
footprint R_0603 (1.6x0.8mm)
pins: 1, 2

## RS_1.6K
designator R?, comment 1.6K
RES SMD 1.6K OHM 1% 1/10W 0603; Cost: 0.16; Value: 1.6K
footprint R_0603 (1.6x0.8mm)
pins: 1, 2

## RS_1K
designator R?, comment 1K
RES 1K OHM 1% 1/10W 0603; Cost: 0.16; Website: https://www.digikey.co.nz/product-detail/en/yageo/RC0603FR-071KL/311-1-00KHRCT-ND/729790; Supplier Part Number 1: 311-1.00KHRCT-ND; Supplier 1: Digi-Key; Value: 1K
footprint R_0603 (1.6x0.8mm)
pins: 1, 2

## RS_1M
designator R?, comment 1M
RES SMD 1M OHM 1% 1/10W 0603; Cost: 0.16; Website: https://www.digikey.co.nz/product-detail/en/yageo/RC0603FR-071ML/311-1-00MHRCT-ND/729791; Value: 1M
footprint R_0603 (1.6x0.8mm)
pins: 1, 2

## RS_1R
designator R?, comment 1R
1 Ohms ±1% 0.5W, 1/2W Chip Resistor 1206 (3216 Metric) Automotive AEC-Q200, Pulse Withstanding Thick Film; Component: SR1206FR-7W1RL; Value: 1R
footprint R_1206 (Chip Inductor, Body 3.2x1.6mm, IPC Low Density)
pins: 1, 2

## RS_2.2K
designator R?, comment 2.2K
RES SMD 2.2K OHM 1% 1/10W 0603; Cost: 0.16; Website: https://www.digikey.co.nz/product-detail/en/yageo/RC0603FR-072K2L/311-2-20KHRCT-ND/729963; Value: 2.2K
footprint R_0603 (1.6x0.8mm)
pins: 1, 2

## RS_2.7K
designator R?, comment 2.7K
RES SMD 2.7K OHM 1% 1/10W 0603; Cost: 0.16; Value: 2.7K
footprint R_0603 (1.6x0.8mm)
pins: 1, 2

## RS_2.49K
designator R?, comment 2.49K
RES SMD 2.49K OHM 1% 1/10W 0603; Value: 2.49K
footprint R_0603 (1.6x0.8mm)
pins: 1, 2

## RS_2M
designator R?, comment 2M
RES SMD 2M OHM 1% 1/10W 0603; Cost: 0.16; Website: https://www.digikey.co.nz/product-detail/en/yageo/RC0603FR-072ML/311-2-00MHRCT-ND/729957; Value: 2M
footprint R_0603 (1.6x0.8mm)
pins: 1, 2

## RS_3.3K
designator R?, comment 3.3K
RES SMD 3.3K OHM 1% 1/10W 0603; Cost: 0.16; Website: https://www.digikey.co.nz/product-detail/en/yageo/RC0603FR-073K3L/311-3-30KHRCT-ND/730073; Value: 3.3K
footprint R_0603 (1.6x0.8mm)
pins: 1, 2

## RS_4.7K
designator R?, comment 4.7K
RES SMD 4.7K OHM 1% 1/10W 0603; Value: 4.7K
footprint R_0603 (1.6x0.8mm)
pins: 1, 2

## RS_5.1K
designator R?, comment 5.1K
RES SMD 5.1K OHM 1% 1/10W 0603; Cost: 0.16; Value: 5.1K
footprint R_0603 (1.6x0.8mm)
pins: 1, 2

## RS_5.1R
designator R?, comment 5.1R
RES SMD 5.1 OHM 1% 1/10W 0603; Cost: 0.16; Website: https://www.digikey.co.nz/product-detail/en/yageo/RC0603FR-075R1L/YAG3372CT-ND/5962194; Value: 5.1R
footprint R_0603 (1.6x0.8mm)
pins: 1, 2

## RS_5.6K
designator R?, comment 5.6K
RES SMD 5.6K OHM 1% 1/10W 0603; Cost: 0.16; Value: 5.6K
footprint R_0603 (1.6x0.8mm)
pins: 1, 2

## RS_10K
designator R?, comment 10K
RES SMD 10K OHM 1% 1/10W 0603; Cost: 0.16; Website: https://www.digikey.co.nz/product-detail/en/yageo/RC0603FR-0710KL/311-10-0KHRCT-ND/729827; Value: 10K
footprint R_0603 (1.6x0.8mm)
pins: 1, 2

## RS_12K
designator R?, comment 12K
RES SMD 12K OHM 1% 1/10W 0603; Cost: 0.16; Website: https://www.digikey.co.nz/product-detail/en/yageo/RC0603FR-0712KL/311-12-0KHRCT-ND/729860; Value: 12K
footprint R_0603 (1.6x0.8mm)
pins: 1, 2

## RS_40K
designator R?, comment 40K
RES SMD 40K OHM 1% 1/10W 0603; Value: 40K
footprint R_0603 (1.6x0.8mm)
pins: 1, 2

## RS_62.5K
designator R?, comment 62.5K
RES SMD 62.5K OHM 1% 1/10W 0603; Value: 62.5K
footprint R_0603 (1.6x0.8mm)
pins: 1, 2

## RS_100K
designator R?, comment 100K
RES 100K OHM 1% 1/10W 0603; Cost: 0.16; Website: https://www.digikey.co.nz/product-detail/en/yageo/RC0603FR-07100KL/311-100KHRCT-ND/729836; Value: 100K
footprint R_0603 (1.6x0.8mm)
pins: 1, 2

## RS_127K
designator R?, comment 127K
RES SMD 127K OHM 1% 1/10W 0603; Cost: 0.16; Website: https://www.digikey.co.nz/product-detail/en/yageo/RC0603FR-07127KL/311-127KHRCT-ND/729874; Value: 127K
footprint R_0603 (1.6x0.8mm)
pins: 1, 2

## RS_510K
designator R?, comment 510K
RES SMD 510K OHM 1% 1/10W 0603; Cost: 0.16; Website: https://www.digikey.co.nz/product-detail/en/yageo/RC0603FR-07510KL/311-510KHRCT-ND/730233; Value: 510K
footprint R_0603 (1.6x0.8mm)
pins: 1, 2

## RS_NC
designator R?, comment NC
NC - 0603; Value: NC
footprint R_0603_NC (1.6x0.8mm)
pins: 1, 2
text: DNF